# Altium footprint library UZ_A_Testboard.PcbLib: 19 footprints (part 1 of 2)
Each footprint in its own frame and in the unit in brackets; x right, y up, seen from the top. Pads: shape width x height; smd on the part's side, far side on the other; paste and mask are expansions set on the pad; w line width, h text height; cw(c..) or ccw(c..) is an arc to the next point about the centre after c.
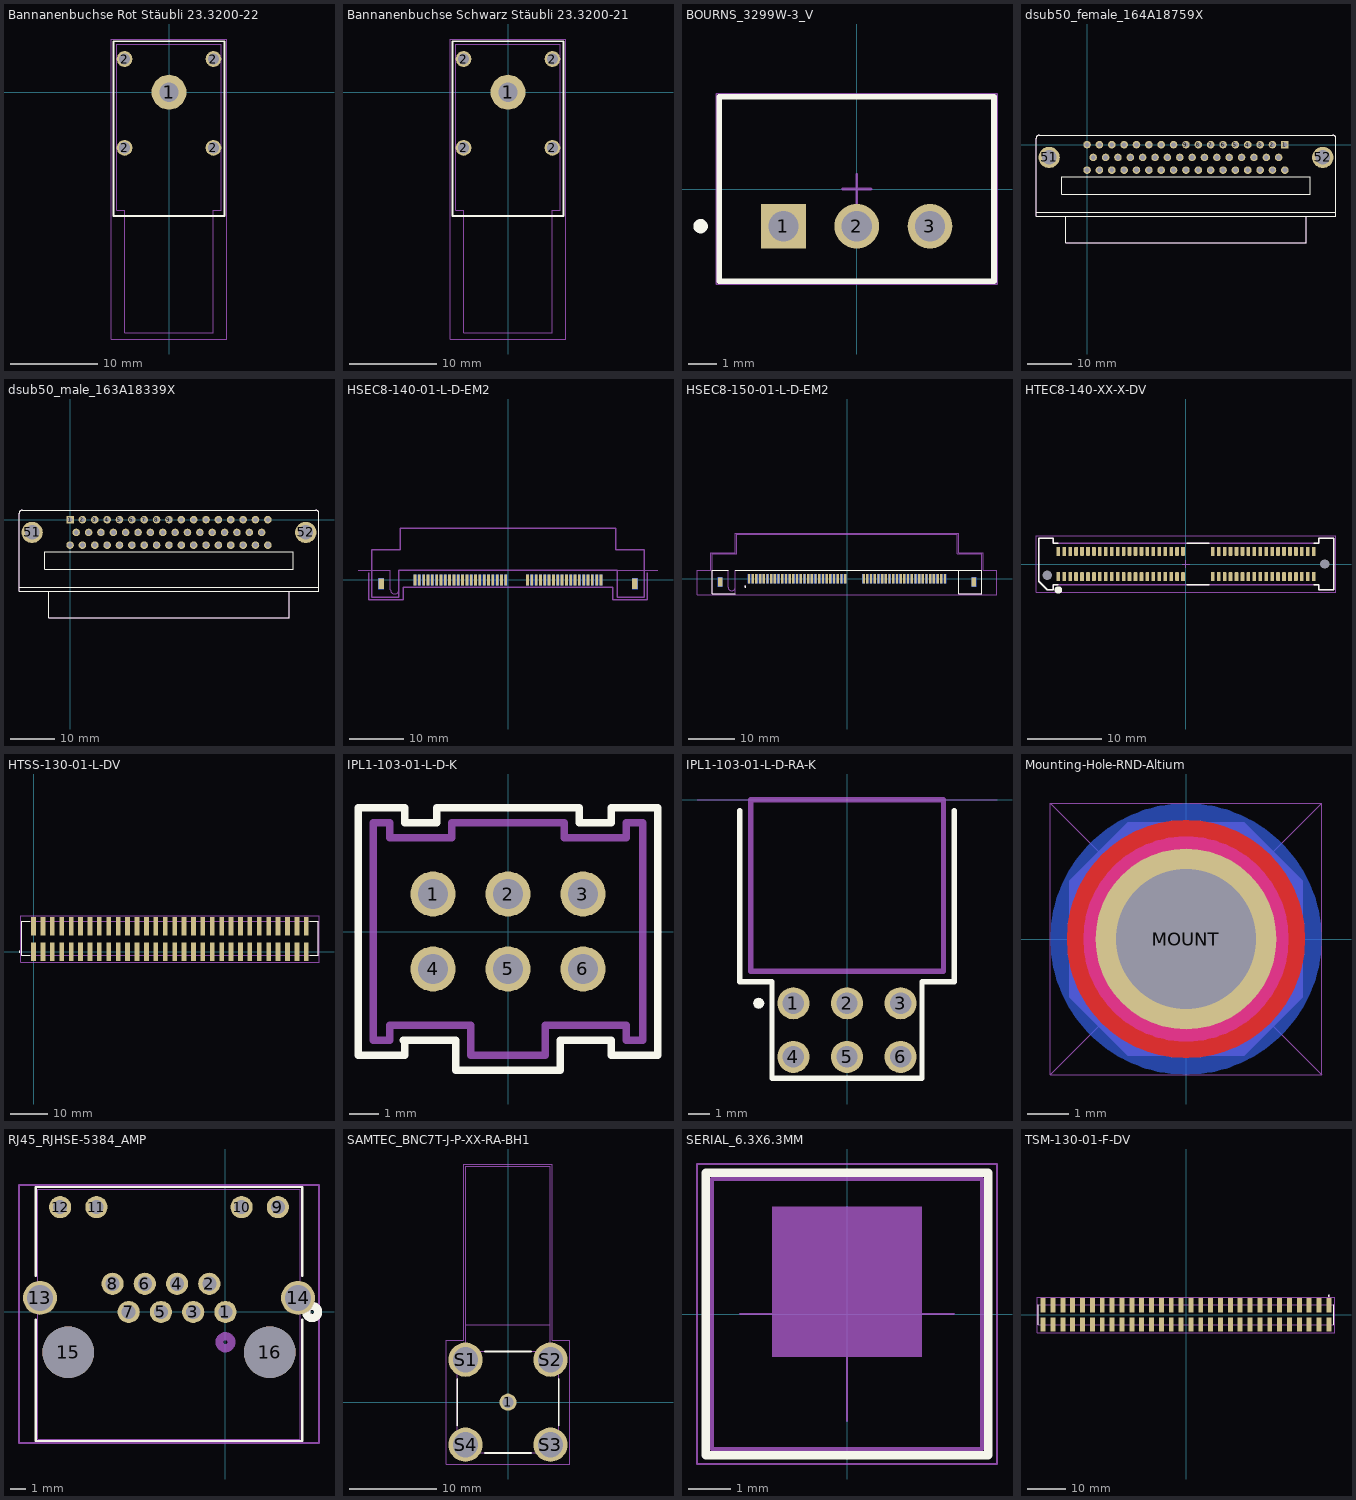
[diagram p0: the footprints below, top view; thin cyan lines are the x and y axes]

## Bannanenbuchse Rot Stäubli 23.3200-22 [mm] "Bananenstecker-Buchse, 4mm, Leiterplattenmontage, 24 A, 1 kV"
height 11.5
pads (5):
  round 4 hole 2.2: 1(0,0)
  round 1.8 hole 1.3: 2(-5.08,-6.36) 2(-5.08,3.8) 2(5.08,-6.36) 2(5.08,3.8)
Top Layer:
  lines w0.254: -0.275,0.275 0,0
Top Overlay:
  lines w0.2: -6.35,-14.138 -6.35,5.832 6.35,5.832 6.35,-14.138 -6.35,-14.138
Top Courtyard:
  lines w0.05: -6.604,-28.204 -6.604,6.086 6.604,6.086 6.604,-28.204
  lines w0.1: -6.604,-28.204 6.604,-28.204
Mechanical 5:
  lines w0.1: -6,-13.5 -5.08,-13.5 -5.08,-27.5 5.08,-27.5 5.08,-13.5 6,-13.5 6,5.5 -6,5.5 -6,-13.5
  text ".Designator" at -0.37,-0.635 h0.76
3D body "10053171.stp": height 12.45, standoff -2.55, extent -6,-27.525 6,5.475

## Bannanenbuchse Schwarz Stäubli 23.3200-21 [mm] "Bananenstecker-Buchse, 4mm, Leiterplattenmontage, 24 A, 1 kV"
height 11.5
pads (5):
  round 4 hole 2.2: 1(0,0)
  round 1.8 hole 1.3: 2(-5.08,-6.36) 2(-5.08,3.8) 2(5.08,-6.36) 2(5.08,3.8)
Top Layer:
  lines w0.254: -0.275,0.275 0,0
Top Overlay:
  lines w0.2: -6.35,-14.138 -6.35,5.832 6.35,5.832 6.35,-14.138 -6.35,-14.138
Keep-Out Layer:
  board cut-out: 5.682,0.269
Top Courtyard:
  lines w0.05: -6.604,-28.204 -6.604,6.086 6.604,6.086 6.604,-28.204
  lines w0.1: -6.604,-28.204 6.604,-28.204
Mechanical 5:
  lines w0.1: -6,-13.5 -6,5.5 6,5.5 6,-13.5 5.08,-13.5 5.08,-27.5 -5.08,-27.5 -5.08,-13.5 -6,-13.5
  text ".Designator" at -0.37,-0.635 h0.76
3D body "10053171.stp": height 12.45, standoff -2.55, extent -6,-27.525 6,5.475

## BOURNS_3299W-3_V [mm] "TH, 3-Leads, Body 9.53x6.4mm, Pitch 2.54mm"
height 11.8
pads (3):
  rect 1.55x1.55 hole 1.05: 1(-2.54,-1.29)
  round 1.55 hole 1.05: 2(0,-1.29) 3(2.54,-1.29)
Top Overlay:
  circle w0.25: c-5.415,-1.29 r0.125
  lines w0.2: -4.765,-3.2 4.765,-3.2 4.765,3.2 -4.765,3.2 -4.765,-3.2
Mechanical 5:
  lines w0.1: -4.765,-3.2 -4.765,3.2 4.765,3.2 4.765,-3.2 -4.765,-3.2
  text ".Designator" at -1,-0.8 h1.52
Mechanical 15:
  lines w0.05: -4.865,-3.3 4.865,-3.3 4.865,3.3 -4.865,3.3 -4.865,-3.3
  lines w0.1: -0.5,0 0.5,0 ; 0,-0.5 0,0.5
3D body "3299W.stp": height 11.55, standoff -6.23, extent -4.763,-3.048 4.762,3.048

## dsub50_female_164A18759X [mm]
height 1.08
pads (52):
  rect 1.69x1.69 hole 1.09: 1(44.176,0)
  round 1.69 hole 1.09: 2(41.415,0) 3(38.654,0) 4(35.893,0) 5(33.132,0) 6(30.371,0) 7(27.61,0) 8(24.849,0) 9(22.088,0) 10(19.327,0) 11(16.566,0) 12(13.805,0) 13(11.044,0) 14(8.283,0) 15(5.522,0) 16(2.761,0) 17(0,0) 18(42.795,-2.84) 19(40.035,-2.84) 20(37.274,-2.84) 21(34.512,-2.84) 22(31.752,-2.84) 23(28.99,-2.84) 24(26.23,-2.84) 25(23.469,-2.84) 26(20.707,-2.84) 27(17.947,-2.84) 28(15.185,-2.84) 29(12.425,-2.84) 30(9.664,-2.84) 31(6.902,-2.84) 32(4.142,-2.84) 33(1.38,-2.84) 34(44.176,-5.68) 35(41.415,-5.68) 36(38.654,-5.68) 37(35.893,-5.68) 38(33.132,-5.68) 39(30.371,-5.68) 40(27.61,-5.68) 41(24.849,-5.68) 42(22.088,-5.68) 43(19.327,-5.68) 44(16.566,-5.68) 45(13.805,-5.68) 46(11.044,-5.68) 47(8.283,-5.68) 48(5.522,-5.68) 49(2.761,-5.68) 50(0,-5.68)
  round 4.76 hole 3.26: 51(-8.467,-2.84) 52(52.643,-2.84)
Top Overlay:
  lines w0.2: -11.4,-15.08 55.6,-15.08 ; -11.4,1.42 -11.4,-15.98 55.6,-15.98 55.6,1.42 ; -11.395,1.425 cw(c-10.7,1.425) -10.7,2.12 54.9,2.12 cw(c54.9,1.425) 55.595,1.425 ; -4.78,-15.98 -4.78,-21.9 48.98,-21.9 48.98,-15.98 ; -5.6,-11.1 -5.6,-7.1 49.8,-7.1 49.8,-11.1 -5.6,-11.1
Mechanical 5:
  lines w0.2: -11.4,1.42 -11.4,-15.98 55.6,-15.98 55.6,1.42 ; -11.395,1.425 cw(c-10.7,1.425) -10.7,2.12 54.9,2.12 cw(c54.9,1.425) 55.595,1.425 ; -4.78,-15.98 -4.78,-21.9 48.98,-21.9 48.98,-15.98
  text ".Designator" at 18.928,-6.842 h1.52
3D body "164A18759X.stp": height 16.35, standoff -3.86, extent -11.425,-22.048 55.575,2.132

## dsub50_male_163A18339X [mm]
pads (52):
  rect 1.69x1.69 hole 1.09: 1(0,0)
  round 1.69 hole 1.09: 2(2.761,0) 3(5.522,0) 4(8.283,0) 5(11.044,0) 6(13.805,0) 7(16.566,0) 8(19.327,0) 9(22.088,0) 10(24.849,0) 11(27.61,0) 12(30.371,0) 13(33.132,0) 14(35.893,0) 15(38.654,0) 16(41.415,0) 17(44.176,0) 18(1.381,-2.84) 19(4.142,-2.84) 20(6.903,-2.84) 21(9.664,-2.84) 22(12.425,-2.84) 23(15.186,-2.84) 24(17.946,-2.84) 25(20.707,-2.84) 26(23.469,-2.84) 27(26.23,-2.84) 28(28.991,-2.84) 29(31.752,-2.84) 30(34.512,-2.84) 31(37.273,-2.84) 32(40.034,-2.84) 33(42.795,-2.84) 34(0,-5.68) 35(2.761,-5.68) 36(5.522,-5.68) 37(8.283,-5.68) 38(11.044,-5.68) 39(13.805,-5.68) 40(16.566,-5.68) 41(19.327,-5.68) 42(22.088,-5.68) 43(24.849,-5.68) 44(27.61,-5.68) 45(30.371,-5.68) 46(33.132,-5.68) 47(35.893,-5.68) 48(38.654,-5.68) 49(41.415,-5.68) 50(44.176,-5.68)
  round 4.76 hole 3.26: 51(-8.467,-2.84) 52(52.643,-2.84)
Top Overlay:
  lines w0.2: -11.4,-15.08 55.6,-15.08 ; -11.4,1.42 -11.4,-15.98 55.6,-15.98 55.6,1.42 ; -11.395,1.425 cw(c-10.7,1.425) -10.7,2.12 54.9,2.12 cw(c54.9,1.425) 55.595,1.425 ; -4.78,-15.98 -4.78,-21.9 48.98,-21.9 48.98,-15.98 ; -5.6,-11.1 -5.6,-7.1 49.8,-7.1 49.8,-11.1 -5.6,-11.1
Mechanical 5:
  lines w0.2: -11.4,1.42 -11.4,-15.98 55.6,-15.98 55.6,1.42 ; -11.395,1.425 cw(c-10.7,1.425) -10.7,2.12 54.9,2.12 cw(c54.9,1.425) 55.595,1.425 ; -4.78,-15.98 -4.78,-21.9 48.98,-21.9 48.98,-15.98
  text ".Designator" at 18.928,-6.842 h1.52
3D body "163A18339X.stp": height 16.34, standoff -3.97, extent -11.425,-21.988 55.575,2.112

## HSEC8-140-01-L-D-EM2 [mm]
pads (84):
  rect 0.5x2 smd mask+0: 1(-17.2,0) 3(-16.4,0) 5(-15.6,0) 7(-14.8,0) 9(-14,0) 11(-13.2,0) 13(-12.4,0) 15(-11.6,0) 17(-10.8,0) 19(-10,0) 21(-9.2,0) 23(-8.4,0) 25(-7.6,0) 27(-6.8,0) 29(-6,0) 31(-5.2,0) 33(-4.4,0) 35(-3.6,0) 37(-2.8,0) 39(-2,0) 41(-1.2,0) 43(-0.4,0) 45(3.6,0) 47(4.4,0) 49(5.2,0) 51(6,0) 53(6.8,0) 55(7.6,0) 57(8.4,0) 59(9.2,0) 61(10,0) 63(10.8,0) 65(11.6,0) 67(12.4,0) 69(13.2,0) 71(14,0) 73(14.8,0) 75(15.6,0) 77(16.4,0) 79(17.2,0)
  rect 0.5x2 smd far side mask+0: 2(-17.2,0) 4(-16.4,0) 6(-15.6,0) 8(-14.8,0) 10(-14,0) 12(-13.2,0) 14(-12.4,0) 16(-11.6,0) 18(-10.8,0) 20(-10,0) 22(-9.2,0) 24(-8.4,0) 26(-7.6,0) 28(-6.8,0) 30(-6,0) 32(-5.2,0) 34(-4.4,0) 36(-3.6,0) 38(-2.8,0) 40(-2,0) 42(-1.2,0) 44(-0.4,0) 46(3.6,0) 48(4.4,0) 50(5.2,0) 52(6,0) 54(6.8,0) 56(7.6,0) 58(8.4,0) 60(9.2,0) 62(10,0) 64(10.8,0) 66(11.6,0) 68(12.4,0) 70(13.2,0) 72(14,0) 74(14.8,0) 76(15.6,0) 78(16.4,0) 80(17.2,0)
  rect 1x2 smd mask+0: G1(-23.45,-0.7) G3(23.45,-0.7)
  rect 1x2 smd far side mask+0: G2(-23.45,-0.7) G4(23.45,-0.7)
Top Paste:
  drawing of 42 lines, arcs and shapes, not listed
Bottom Paste:
  drawing of 42 lines, arcs and shapes, not listed
Top Solder:
  drawing of 42 lines, arcs and shapes, not listed
Bottom Solder:
  drawing of 42 lines, arcs and shapes, not listed
Mechanical 1:
  lines w0.025: -27.737,1.8 -21.732,1.8 -21.732,-1.799 ccw(c-20.945,-1.799) -20.157,-1.799 -20.157,1.8 27.737,1.8
Mechanical 5:
  lines w0.254: -25.197,-3.204 -20.218,-3.204 -20.218,1.8 20.218,1.8 20.218,-3.204 25.197,-3.204 25.197,5.61 19.901,5.61 19.901,9.598 -19.901,9.598 -19.901,5.61 -25.197,5.61 -25.197,-3.204
Mechanical 7:
  lines w0.254: -25.705,1.292 -25.705,-3.712 -19.393,-3.712 -19.393,-1.38 19.393,-1.38 19.393,-3.712 25.705,-3.712 25.705,1.292
  text "79" at 17,-3 h1.86
  text "1" at -17,-3 h1.86
Mechanical 8:
  text "80" at 17,-3 h1.86
  text "2" at -17,-3 h1.86
Mechanical 32:
  lines w0.127: -25.705,1.292 -25.705,-3.712 -19.393,-3.712 -19.393,-1.38 19.393,-1.38 19.393,-3.712 25.705,-3.712 25.705,1.292
3D body "HSEC8-140-01-L-D-EM2.stp": height 3.3, standoff -3.7, extent -25.2,-3.266 25.2,9.534

## HSEC8-150-01-L-D-EM2 [mm]
pads (104):
  rect 0.5x2 smd: 01(-21.2,0) 03(-20.4,0) 05(-19.6,0) 07(-18.8,0) 09(-18,0) 11(-17.2,0) 13(-16.4,0) 15(-15.6,0) 17(-14.8,0) 19(-14,0) 21(-13.2,0) 23(-12.4,0) 25(-11.6,0) 27(-10.8,0) 29(-10,0) 31(-9.2,0) 33(-8.4,0) 35(-7.6,0) 37(-6.8,0) 39(-6,0) 41(-5.2,0) 43(-4.4,0) 45(-3.6,0) 47(-2.8,0) 49(-2,0) 51(-1.2,0) 53(-0.4,0) 55(3.6,0) 57(4.4,0) 59(5.2,0) 61(6,0) 63(6.8,0) 65(7.6,0) 67(8.4,0) 69(9.2,0) 71(10,0) 73(10.8,0) 75(11.6,0) 77(12.4,0) 79(13.2,0) 81(14,0) 83(14.8,0) 85(15.6,0) 87(16.4,0) 89(17.2,0) 91(18,0) 93(18.8,0) 95(19.6,0) 97(20.4,0) 99(21.2,0)
  rect 0.5x2 smd far side: 02(-21.2,0) 04(-20.4,0) 06(-19.6,0) 08(-18.8,0) 10(-18,0) 12(-17.2,0) 14(-16.4,0) 16(-15.6,0) 18(-14.8,0) 20(-14,0) 22(-13.2,0) 24(-12.4,0) 26(-11.6,0) 28(-10.8,0) 30(-10,0) 32(-9.2,0) 34(-8.4,0) 36(-7.6,0) 38(-6.8,0) 40(-6,0) 42(-5.2,0) 44(-4.4,0) 46(-3.6,0) 48(-2.8,0) 50(-2,0) 52(-1.2,0) 54(-0.4,0) 56(3.6,0) 58(4.4,0) 60(5.2,0) 62(6,0) 64(6.8,0) 66(7.6,0) 68(8.4,0) 70(9.2,0) 72(10,0) 74(10.8,0) 76(11.6,0) 78(12.4,0) 80(13.2,0) 82(14,0) 84(14.8,0) 86(15.6,0) 88(16.4,0) 90(17.2,0) 92(18,0) 94(18.8,0) 96(19.6,0) 98(20.4,0) 100(21.2,0)
  rect 1x2 smd: S1(-27.45,-0.7) S3(27.45,-0.7)
  rect 1x2 smd far side: S2(-27.45,-0.7) S4(27.45,-0.7)
Top Overlay:
  circle w0.2: c-22,-1.7 r0.1
  lines w0.2: -25.725,1.8 -29.2,1.8 -29.2,-3.2 -28.3,-3.2 -24.21,-3.2 ; -24.175,1.8 24.21,1.8 ; 24.21,1.8 24.21,-3.2 28.3,-3.2 29.2,-3.2 29.2,1.8 24.21,1.8
Bottom Overlay:
  lines w0.2: -25.725,1.8 -29.2,1.8 -29.2,-3.2 -28.3,-3.2 -24.21,-3.2 ; -24.175,1.8 24.21,1.8 ; 24.21,1.8 24.21,-3.2 28.3,-3.2 29.2,-3.2 29.2,1.8 24.21,1.8
Mechanical 1:
  lines w0: -29.2,1.8 -25.725,1.8 -25.725,-1.8 ; 29.2,1.8 -24.175,1.8 -24.175,-1.8 ; -25.725,-1.8 ccw(c-24.95,-1.8) -24.95,-2.575 ; -25.725,-1.8 ccw(c-24.95,-1.8) -24.95,-2.575 ; -24.95,-2.575 ccw(c-24.95,-1.8) -24.176,-1.8 ; -24.95,-2.575 ccw(c-24.95,-1.8) -24.176,-1.8
Mechanical 5:
  circle w0.2: c-22,-1.7 r0.1
  lines w0.05: -32.45,-3.45 -29.45,-3.45 29.45,-3.45 32.45,-3.45 32.45,1.8 29.45,1.8 29.45,5.65 24.15,5.65 24.15,9.85 -24.15,9.85 -24.15,5.65 -29.45,5.65 -29.45,1.8 -32.45,1.8 -32.45,-3.45
  lines w0.1: -29.2,-3.2 -24.21,-3.2 ; -29.2,-3.2 -24.21,-3.2 ; -29.2,-3.2 -29.2,1.8 ; -29.2,-3.2 -29.2,1.8 ; -29.2,1.8 -25.725,1.8 ; -29.2,1.8 -25.725,1.8 ; -29.2,1.8 -29.2,5.4 ; -29.2,1.8 -29.2,5.4 ; -29.2,5.4 -23.9,5.4 ; -29.2,5.4 -23.9,5.4 ; -25.725,-1.8 ccw(c-24.95,-1.8) -24.95,-2.575 ; -25.725,-1.8 ccw(c-24.95,-1.8) -24.95,-2.575 ; -25.725,-1.8 -25.725,1.8 ; -25.725,-1.8 -25.725,1.8 ; -24.95,-2.575 ccw(c-24.95,-1.8) -24.176,-1.8 ; -24.95,-2.575 ccw(c-24.95,-1.8) -24.176,-1.8 ; -24.21,-3.2 -24.21,-2.03 -24.21,-3.2 ; -24.175,-1.8 -24.175,1.8 ; -24.175,-1.8 -24.175,1.8 ; -24.175,1.8 24.21,1.8 ; -24.175,1.8 24.21,1.8 ; -23.9,5.4 -23.9,9.6 ; -23.9,5.4 -23.9,9.6 ; -23.9,9.6 23.9,9.6 ; -23.9,9.6 23.9,9.6 ; 23.9,5.4 29.2,5.4 ; 23.9,5.4 29.2,5.4 ; 23.9,5.4 23.9,9.6 ; 23.9,5.4 23.9,9.6 ; 24.21,-3.2 29.2,-3.2 ; 24.21,-3.2 29.2,-3.2 ; 24.21,-3.2 24.21,1.8 ; 24.21,-3.2 24.21,1.8 ; 24.21,1.8 29.2,1.8 ; 24.21,1.8 29.2,1.8 ; 29.2,-3.2 29.2,1.8 ; 29.2,-3.2 29.2,1.8 ; 29.2,1.8 29.2,5.4 ; 29.2,1.8 29.2,5.4
  text ".Designator" at 0.773,-0.508 h0.76
  text "PCB EDGE" at -3,2 h0.81
Mechanical 15:
  lines w0.05: -32.45,-3.45 -32.45,1.8 -29.45,1.8 -29.45,5.65 -24.15,5.65 -24.15,9.85 24.15,9.85 24.15,5.65 29.45,5.65 29.45,1.8 32.45,1.8 32.45,-3.45 -32.45,-3.45
3D body "HSEC8-150-01-L-D-EM2.stp": height 3.72, standoff -3.95, extent -29.21,-3.497 29.19,9.652

## HTEC8-140-XX-X-DV [mm]
height 7.98
pads (82):
  rrect30% 0.5x1.2 smd mask+0.05: 1(-17.2,-1.7) 2(-17.2,1.7) 3(-16.4,-1.7) 4(-16.4,1.7) 5(-15.6,-1.7) 6(-15.6,1.7) 7(-14.8,-1.7) 8(-14.8,1.7) 9(-14,-1.7) 10(-14,1.7) 11(-13.2,-1.7) 12(-13.2,1.7) 13(-12.4,-1.7) 14(-12.4,1.7) 15(-11.6,-1.7) 16(-11.6,1.7) 17(-10.8,-1.7) 18(-10.8,1.7) 19(-10,-1.7) 20(-10,1.7) 21(-9.2,-1.7) 22(-9.2,1.7) 23(-8.4,-1.7) 24(-8.4,1.7) 25(-7.6,-1.7) 26(-7.6,1.7) 27(-6.8,-1.7) 28(-6.8,1.7) 29(-6,-1.7) 30(-6,1.7) 31(-5.2,-1.7) 32(-5.2,1.7) 33(-4.4,-1.7) 34(-4.4,1.7) 35(-3.6,-1.7) 36(-3.6,1.7) 37(-2.8,-1.7) 38(-2.8,1.7) 39(-2,-1.7) 40(-2,1.7) 41(-1.2,-1.7) 42(-1.2,1.7) 43(-0.4,-1.7) 44(-0.4,1.7) 45(3.6,-1.7) 46(3.6,1.7) 47(4.4,-1.7) 48(4.4,1.7) 49(5.2,-1.7) 50(5.2,1.7) 51(6,-1.7) 52(6,1.7) 53(6.8,-1.7) 54(6.8,1.7) 55(7.6,-1.7) 56(7.6,1.7) 57(8.4,-1.7) 58(8.4,1.7) 59(9.2,-1.7) 60(9.2,1.7) 61(10,-1.7) 62(10,1.7) 63(10.8,-1.7) 64(10.8,1.7) 65(11.6,-1.7) 66(11.6,1.7) 67(12.4,-1.7) 68(12.4,1.7) 69(13.2,-1.7) 70(13.2,1.7) 71(14,-1.7) 72(14,1.7) 73(14.8,-1.7) 74(14.8,1.7) 75(15.6,-1.7) 76(15.6,1.7) 77(16.4,-1.7) 78(16.4,1.7) 79(17.2,-1.7) 80(17.2,1.7)
  round 0 hole 1.27 unplated: MH1(-18.7,-1.5) MH2(18.7,0)
Top Overlay:
  circle w0.5: c-17.2,-3.5 r0.25
  lines w0.178: -17.2,-2.8 -17.9,-2.8 -17.9,-3.5 -18.7,-3.5 -19.85,-2.35 -19.85,3.5 -17.9,3.5 -17.9,2.8 -17.2,2.8 ; 0.1,-2.8 3.1,-2.8 ; 0.1,2.8 3.1,2.8 ; 17.2,-2.8 17.9,-2.8 17.9,-3.5 19.9,-3.5 19.9,3.5 ; 17.2,2.8 17.9,2.8 17.9,3.5 19.9,3.5
Mechanical 5:
  lines w0.178: -19.85,-2.35 -18.7,-3.5 -17.9,-3.5 -17.9,-2.8 17.9,-2.8 17.9,-3.5 19.9,-3.5 19.9,3.5 17.9,3.5 17.9,2.8 -17.9,2.8 -17.9,3.5 -19.85,3.5 -19.85,-2.35
  text "79" at 16.6,-2.15 h1
  text "80" at 16.35,1.1 h1
  text "45" at 3,-2.15 h1
  text "46" at 2.75,1.1 h1
  text ".Designator" at 1.45,-0.3 h1
  text "43" at -1,-2.15 h1
  text "44" at -1.25,1.1 h1
  text "1" at -17.3,-2.15 h1
  text "2" at -17.55,1.1 h1
Mechanical 15:
  lines w0.05: -0.5,0 0.5,0 ; 0,-0.5 0,0.5 ; -20.2,-3.8 20.2,-3.8 20.2,3.8 -20.2,3.8 -20.2,-3.8
3D body "HTEC8-140-01-L-DV.stp": height 8, standoff 0, extent -19.9,-3.5 19.9,3.5

## HTSS-130-01-L-DV [mil]
pads (60):
  rect 50x200 smd: 01(0,0) 02(0,270) 03(100,0) 04(100,270) 05(200,0) 06(200,270) 07(300,0) 08(300,270) 09(400,0) 10(400,270) 11(500,0) 12(500,270) 13(600,0) 14(600,270) 15(700,0) 16(700,270) 17(800,0) 18(800,270) 19(900,0) 20(900,270) 21(1000,0) 22(1000,270) 23(1100,0) 24(1100,270) 25(1200,0) 26(1200,270) 27(1300,0) 28(1300,270) 29(1400,0) 30(1400,270) 31(1500,0) 32(1500,270) 33(1600,0) 34(1600,270) 35(1700,0) 36(1700,270) 37(1800,0) 38(1800,270) 39(1900,0) 40(1900,270) 41(2000,0) 42(2000,270) 43(2100,0) 44(2100,270) 45(2200,0) 46(2200,270) 47(2300,0) 48(2300,270) 49(2400,0) 50(2400,270) 51(2500,0) 52(2500,270) 53(2600,0) 54(2600,270) 55(2700,0) 56(2700,270) 57(2800,0) 58(2800,270) 59(2900,0) 60(2900,270)
Top Overlay:
  circle w7.87: c-150.59,0 r3.94
  lines w7.87: -38.78,-40 -125,-40 -125,325 -38.78,325 ; 2938.78,-40 3025,-40 3025,325 2938.78,325
Mechanical 5:
  circle w7.87: c-150.59,0 r3.94
  lines w3.94: -125,-40 3025,-40 3025,325 -125,325 -125,-40
  text ".Designator" at 1425.43,120 h30
Mechanical 15:
  lines w1.97: -134.84,-109.84 3034.84,-109.84 3034.84,379.84 -134.84,379.84 -134.84,-109.84
3D body "HTSS-130-01-L-DV.stp": height 400, standoff 0, extent -124.99,-84.99 3025,355.01

## IPL1-103-01-L-D-K [mil]
pads (6):
  round 60 hole 40 mask+3: 1(-100,50) 2(0,50) 3(100,50) 4(-100,-50) 5(0,-50) 6(100,-50)
Top Overlay:
  lines w10: -140,-145 -70,-145 -70,-185 70,-185 70,-145 138,-145 138,-165 200,-165 200,165 138,165 138,145 95,145 95,165 -95,165 -95,145 -138,145 -138,165 -200,165 -200,-165 -138,-165 -138,-145
Mechanical 5:
  lines w10: -180,-145 -180,145 -158,145 -158,125 -75,125 -75,145 75,145 75,125 158,125 158,145 180,145 180,-145 158,-145 158,-125 50,-125 50,-165 -50,-165 -50,-125 -158,-125 -158,-145 -180,-145
  text ".Designator" at -34.57,-15 h30
3D body "IPL1-103-01-L-D-K.stp": height 320, standoff -120, extent -180,-165 180,145

## IPL1-103-01-L-D-RA-K [mil]
pads (6):
  round 60 hole 40 mask+3: 1(-100,-380) 2(0,-380) 3(100,-380) 4(-100,-480) 5(0,-480) 6(100,-480)
Top Overlay:
  region: -154.8,-380 -155.58,-376.1 -157.79,-372.79 -161.1,-370.58 -165,-369.8 -168.9,-370.58 -172.21,-372.79 -174.42,-376.1 -175.2,-380 -174.42,-383.9 -172.21,-387.21 -168.9,-389.42 -165,-390.2 -161.1,-389.42 -157.79,-387.21 -155.58,-383.9
  lines w10: -200,-20 -200,-340 -140,-340 -140,-520 140,-520 140,-340 200,-340 200,-20
Mechanical 5:
  lines w10: -180,-320 -180,0 180,0 180,-320 -180,-320
  text ".Designator" at -24.57,-185 h30
Bottom Courtyard:
  lines w0.1: -280,0 280,0
3D body "IPL1-103-01-L-D-RA-K.stp": height 310, standoff -85, extent -179.99,-492.49 180.01,0.01

## Mounting-Hole-RND-Altium [mm] "Mounting Hole, Altium, 4.4mm pad, 3.4mm plated hole"
height 3.5
pads (1):
  round 4.4 hole 3.4 mask+0.038: MOUNT(0,0)
Top Layer:
  circle w1: c0,0 r2.4
Bottom Layer:
  circle w1.2: c0,0 r2.702
Top Solder:
  circle w1.6: c0,0 r2.4
Bottom Solder:
  circle w2.6: c0,0 r2.3
Keep-Out Layer:
  circle w0.6: c0,0 r2.2
Top Courtyard:
  lines w0.025: -3.3,-3.3 -3.3,3.3 ; -3.3,-3.3 3.3,-3.3 ; -3.3,-3.3 0,0 ; -3.3,3.3 0,0 ; -3.3,3.3 3.3,3.3 ; 0,0 3.3,3.3 ; 0,0 3.3,-3.3 ; 3.3,-3.3 3.3,3.3
Mechanical 7:
  circle w0.1: c0,0.002 r2.7
  circle w1.2: c0,0 r2.2
  rectangle: 0.5,0.8 1.6,1.6
  region: 1.6,0.5 1.6,1.6 0.8,1.6 0.8,0.5
  region: 0.5,0.8 0.8,0.5 1.366,1.066 1.066,1.366
  region: 0.8,-0.5 0.8,-1.6 1.6,-1.6 1.6,-0.5
  rectangle: 0.5,-1.6 1.6,-0.8
  region: 0.8,-0.5 0.5,-0.8 1.066,-1.366 1.366,-1.066
  region: -0.8,0.5 -0.8,1.6 -1.6,1.6 -1.6,0.5
  region: -0.5,1.6 -1.6,1.6 -1.6,0.8 -0.5,0.8
  region: -0.8,0.5 -0.5,0.8 -1.066,1.366 -1.366,1.066
  region: -0.5,-0.8 -1.6,-0.8 -1.6,-1.6 -0.5,-1.6
  region: -1.6,-0.5 -1.6,-1.6 -0.8,-1.6 -0.8,-0.5
  region: -0.5,-0.8 -0.8,-0.5 -1.366,-1.066 -1.066,-1.366
Mechanical 8:
  circle w0.6: c0,0 r2
  rectangle: 1.7,-1.4 2.8,1.4
  region: -1.951,-0.551 -2.8,-1.4 -1.4,-2.8 -0.551,-1.951
  region: -0.551,1.951 -1.4,2.8 -2.8,1.4 -1.951,0.551
  region: 1.951,0.551 2.8,1.4 1.4,2.8 0.551,1.951
  region: 0.551,-1.951 1.4,-2.8 2.8,-1.4 1.951,-0.551
  region: -1.4,-1.7 -1.4,-2.8 1.4,-2.8 1.4,-1.7
  region: 1.4,1.7 1.4,2.8 -1.4,2.8 -1.4,1.7
  rectangle: -2.8,-1.4 -1.7,1.4
  lines w0.1: -2.8,-1.4 -1.4,-2.8 1.4,-2.8 2.8,-1.4 2.8,1.4 1.4,2.8 -1.4,2.8 -2.8,1.4 -2.8,-1.4

## RJ45_RJHSE-5384_AMP [mil]
pads (16):
  round 55 hole 35: 1(0,0) 2(-40,70) 3(-80,0) 4(-120,70) 5(-160,0) 6(-200,70) 7(-240,0) 8(-280,70) 9(130,260) 10(40,260) 11(-320,260) 12(-410,260)
  round 84 hole 64: 13(-460,35) 14(180,35)
  round 128 hole 128 unplated: 15(-390,-100) 16(110,-100)
Top Overlay:
  circle w20: c215,0 r15
  lines w6: -470,-19.18 -470,-320 190,-320 190,-19.18 ; -470,89.19 -470,310 190,310 190,89.19
Bottom Overlay:
  circle w20: c215,0 r15
Mechanical 5:
  circle w20: c0,-75 r15
  lines w1: -465,-315 -465,305 185,305 185,-315 -465,-315
Mechanical 15:
  lines w6: -512,-325 -512,315 232,315 232,-325 -512,-325
3D body "7499111446.stp": height 630.23, standoff -138.78, extent -528.46,-540.16 252.86,319.68

## SAMTEC_BNC7T-J-P-XX-RA-BH1 [mm]
pads (5):
  round 1.95 hole 1.3: 1(0,0)
  round 3.916 hole 2.9: S1(-4.85,4.85) S2(4.85,4.85) S3(4.85,-4.85) S4(-4.85,-4.85)
Top Overlay:
  lines w0.2: -5.8,-2.65 -5.8,2.65 ; -2.65,-5.8 2.65,-5.8 ; -2.65,5.8 2.65,5.8 ; 5.8,-2.65 5.8,2.65
Mechanical 5:
  lines w0.1: -4.825,5.8 4.825,5.8 ; -4.825,5.8 -4.825,26.95 4.825,26.95 4.825,5.8 ; -4.825,5.8 -5.8,5.8 -5.8,-5.8 5.8,-5.8 5.8,5.8 4.825,5.8
Mechanical 7:
  lines w0.1: -4.826,8.85 4.826,8.85
  text "PCB Edge" at -4.826,9.525 h1.27
Mechanical 15:
  lines w0.05: -7.06,-7.06 7.06,-7.06 7.06,7.06 5.075,7.06 5.075,27.2 -5.075,27.2 -5.075,7.06 -7.06,7.06 -7.06,-7.06
3D body "BNC7T-J-P-GN-RA-BH1.stp": height 19.3, standoff -3, extent -8,-5.834 8,26.916

## SERIAL_6.3X6.3MM [mm]
Top Overlay:
  lines w0.2: -3.3,-3.3 3.3,-3.3 3.3,3.3 -3.3,3.3 -3.3,-3.3
Mechanical 5:
  region: -1.75,2.5 -1.75,-1 1.75,-1 1.75,2.5
  lines w0.1: -3.15,-3.15 -3.15,3.15 3.15,3.15 3.15,-3.15 -3.15,-3.15
  text "SerialNr" at 2.5,-1.7 h0.7
Mechanical 15:
  lines w0.05: -2.5,0 2.5,0 ; 0,-2.5 0,2.5 ; -3.5,-3.5 3.5,-3.5 3.5,3.5 -3.5,3.5 -3.5,-3.5

## TSM-130-01-F-DV [mm]
pads (60):
  rect 1.27x3.68 smd: 01(36.83,2.475) 02(36.83,-2.475) 03(34.29,2.475) 04(34.29,-2.475) 05(31.75,2.475) 06(31.75,-2.475) 07(29.21,2.475) 08(29.21,-2.475) 09(26.67,2.475) 10(26.67,-2.475) 11(24.13,2.475) 12(24.13,-2.475) 13(21.59,2.475) 14(21.59,-2.475) 15(19.05,2.475) 16(19.05,-2.475) 17(16.51,2.475) 18(16.51,-2.475) 19(13.97,2.475) 20(13.97,-2.475) 21(11.43,2.475) 22(11.43,-2.475) 23(8.89,2.475) 24(8.89,-2.475) 25(6.35,2.475) 26(6.35,-2.475) 27(3.81,2.475) 28(3.81,-2.475) 29(1.27,2.475) 30(1.27,-2.475) 31(-1.27,2.475) 32(-1.27,-2.475) 33(-3.81,2.475) 34(-3.81,-2.475) 35(-6.35,2.475) 36(-6.35,-2.475) 37(-8.89,2.475) 38(-8.89,-2.475) 39(-11.43,2.475) 40(-11.43,-2.475) 41(-13.97,2.475) 42(-13.97,-2.475) 43(-16.51,2.475) 44(-16.51,-2.475) 45(-19.05,2.475) 46(-19.05,-2.475) 47(-21.59,2.475) 48(-21.59,-2.475) 49(-24.13,2.475) 50(-24.13,-2.475) 51(-26.67,2.475) 52(-26.67,-2.475) 53(-29.21,2.475) 54(-29.21,-2.475) 55(-31.75,2.475) 56(-31.75,-2.475) 57(-34.29,2.475) 58(-34.29,-2.475) 59(-36.83,2.475) 60(-36.83,-2.475)
Top Overlay:
  circle w0.2: c36.83,4.9 r0.1
  lines w0.2: -38.1,-2.54 -38.1,2.54 ; 38.1,-2.54 38.1,2.54
Mechanical 5:
  circle w0.2: c36.83,4.9 r0.1
  lines w0.1: -38.1,-2.54 -38.1,2.54 38.1,2.54 38.1,-2.54 -38.1,-2.54
  text ".Designator" at -0.497,-0.508 h0.76
Mechanical 15:
  lines w0.05: -38.35,-4.565 -38.35,4.565 38.35,4.565 38.35,-4.565 -38.35,-4.565
3D body "step_temp.STEP": height 9.91, standoff 0, extent -38.1,-3.848 38.1,3.848